# Altium footprint library Connector_PinHeader_1.27mm.PcbLib: 278 footprints (part 8 of 18)
Each footprint in its own frame and in the unit in brackets; x right, y up, seen from the top. Pads: shape width x height; smd on the part's side, far side on the other; paste and mask are expansions set on the pad; w line width, h text height; cw(c..) or ccw(c..) is an arc to the next point about the centre after c.
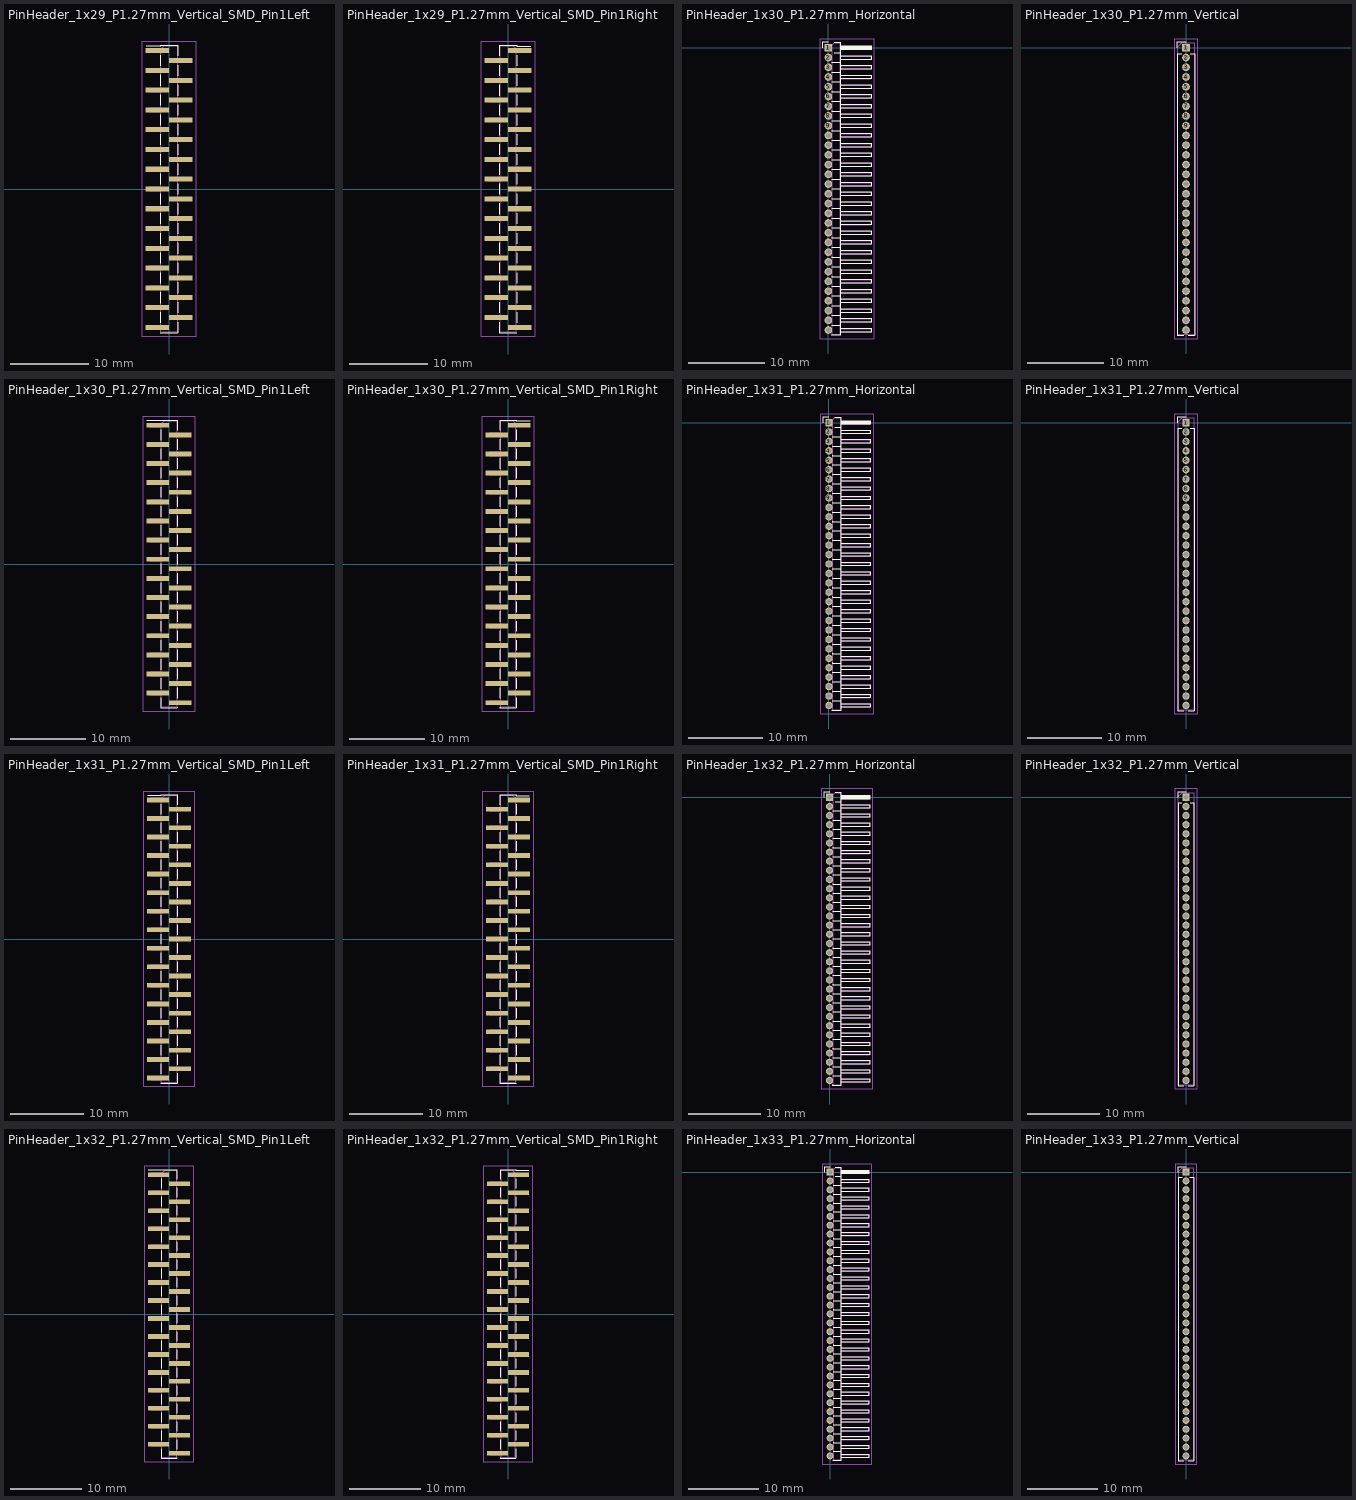
[diagram p7: the footprints below, top view; thin cyan lines are the x and y axes]

## PinHeader_1x29_P1.27mm_Vertical_SMD_Pin1Left [mm]
pads (29):
  rect 3x0.65 smd: 1(-1.5,17.78) 2(1.5,16.51) 3(-1.5,15.24) 4(1.5,13.97) 5(-1.5,12.7) 6(1.5,11.43) 7(-1.5,10.16) 8(1.5,8.89) 9(-1.5,7.62) 10(1.5,6.35) 11(-1.5,5.08) 12(1.5,3.81) 13(-1.5,2.54) 14(1.5,1.27) 15(-1.5,0) 16(1.5,-1.27) 17(-1.5,-2.54) 18(1.5,-3.81) 19(-1.5,-5.08) 20(1.5,-6.35) 21(-1.5,-7.62) 22(1.5,-8.89) 23(-1.5,-10.16) 24(1.5,-11.43) 25(-1.5,-12.7) 26(1.5,-13.97) 27(-1.5,-15.24) 28(1.5,-16.51) 29(-1.5,-17.78)
F.SilkS:
  lines w0.12: -2.94,18.365 -1.11,18.365 -1.11,18.475 1.11,18.475 ; -1.11,-18.475 1.11,-18.475 1.11,-18.365 ; -1.11,-17.195 -1.11,-15.825 ; -1.11,-14.655 -1.11,-13.285 ; -1.11,-12.115 -1.11,-10.745 ; -1.11,-9.575 -1.11,-8.205 ; -1.11,-7.035 -1.11,-5.665 ; -1.11,-4.495 -1.11,-3.125 ; -1.11,-1.955 -1.11,-0.585 ; -1.11,0.585 -1.11,1.955 ; -1.11,3.125 -1.11,4.495 ; -1.11,5.665 -1.11,7.035 ; -1.11,8.205 -1.11,9.575 ; -1.11,10.745 -1.11,12.115 ; -1.11,13.285 -1.11,14.655 ; -1.11,15.825 -1.11,17.195 ; 1.11,-18.465 1.11,-17.095 ; 1.11,-15.925 1.11,-14.555 ; 1.11,-13.385 1.11,-12.015 ; 1.11,-10.845 1.11,-9.475 ; 1.11,-8.305 1.11,-6.935 ; 1.11,-5.765 1.11,-4.395 ; 1.11,-3.225 1.11,-1.855 ; 1.11,-0.685 1.11,0.685 ; 1.11,1.855 1.11,3.225 ; 1.11,4.395 1.11,5.765 ; 1.11,6.935 1.11,8.305 ; 1.11,9.475 1.11,10.845 ; 1.11,12.015 1.11,13.385 ; 1.11,14.555 1.11,15.925 ; 1.11,17.095 1.11,18.465
F.CrtYd:
  lines w0.05: -3.5,-18.95 3.5,-18.95 3.5,18.95 -3.5,18.95 -3.5,-18.95
F.Fab:
  lines w0.1: -1.05,-17.98 -2.5,-17.98 -2.5,-17.58 -1.05,-17.58 ; -1.05,-15.44 -2.5,-15.44 -2.5,-15.04 -1.05,-15.04 ; -1.05,-12.9 -2.5,-12.9 -2.5,-12.5 -1.05,-12.5 ; -1.05,-10.36 -2.5,-10.36 -2.5,-9.96 -1.05,-9.96 ; -1.05,-7.82 -2.5,-7.82 -2.5,-7.42 -1.05,-7.42 ; -1.05,-5.28 -2.5,-5.28 -2.5,-4.88 -1.05,-4.88 ; -1.05,-2.74 -2.5,-2.74 -2.5,-2.34 -1.05,-2.34 ; -1.05,-0.2 -2.5,-0.2 -2.5,0.2 -1.05,0.2 ; -1.05,2.34 -2.5,2.34 -2.5,2.74 -1.05,2.74 ; -1.05,4.88 -2.5,4.88 -2.5,5.28 -1.05,5.28 ; -1.05,7.42 -2.5,7.42 -2.5,7.82 -1.05,7.82 ; -1.05,9.96 -2.5,9.96 -2.5,10.36 -1.05,10.36 ; -1.05,12.5 -2.5,12.5 -2.5,12.9 -1.05,12.9 ; -1.05,15.04 -2.5,15.04 -2.5,15.44 -1.05,15.44 ; -1.05,17.58 -2.5,17.58 -2.5,17.98 -1.05,17.98 ; 1.05,-16.71 2.5,-16.71 2.5,-16.31 1.05,-16.31 ; 1.05,-14.17 2.5,-14.17 2.5,-13.77 1.05,-13.77 ; 1.05,-11.63 2.5,-11.63 2.5,-11.23 1.05,-11.23 ; 1.05,-9.09 2.5,-9.09 2.5,-8.69 1.05,-8.69 ; 1.05,-6.55 2.5,-6.55 2.5,-6.15 1.05,-6.15 ; 1.05,-4.01 2.5,-4.01 2.5,-3.61 1.05,-3.61 ; 1.05,-1.47 2.5,-1.47 2.5,-1.07 1.05,-1.07 ; 1.05,1.07 2.5,1.07 2.5,1.47 1.05,1.47 ; 1.05,3.61 2.5,3.61 2.5,4.01 1.05,4.01 ; 1.05,6.15 2.5,6.15 2.5,6.55 1.05,6.55 ; 1.05,8.69 2.5,8.69 2.5,9.09 1.05,9.09 ; 1.05,11.23 2.5,11.23 2.5,11.63 1.05,11.63 ; 1.05,13.77 2.5,13.77 2.5,14.17 1.05,14.17 ; 1.05,16.31 2.5,16.31 2.5,16.71 1.05,16.71 ; -1.05,17.98 -0.615,18.415 1.05,18.415 1.05,-18.415 -1.05,-18.415 -1.05,17.98
  text "'.Designator'" at 0.84,-4.047 h1

## PinHeader_1x29_P1.27mm_Vertical_SMD_Pin1Right [mm]
pads (29):
  rect 3x0.65 smd: 1(1.5,17.78) 2(-1.5,16.51) 3(1.5,15.24) 4(-1.5,13.97) 5(1.5,12.7) 6(-1.5,11.43) 7(1.5,10.16) 8(-1.5,8.89) 9(1.5,7.62) 10(-1.5,6.35) 11(1.5,5.08) 12(-1.5,3.81) 13(1.5,2.54) 14(-1.5,1.27) 15(1.5,0) 16(-1.5,-1.27) 17(1.5,-2.54) 18(-1.5,-3.81) 19(1.5,-5.08) 20(-1.5,-6.35) 21(1.5,-7.62) 22(-1.5,-8.89) 23(1.5,-10.16) 24(-1.5,-11.43) 25(1.5,-12.7) 26(-1.5,-13.97) 27(1.5,-15.24) 28(-1.5,-16.51) 29(1.5,-17.78)
F.SilkS:
  lines w0.12: -1.11,-18.465 -1.11,-17.095 ; -1.11,-18.365 -1.11,-18.475 1.11,-18.475 ; -1.11,-15.925 -1.11,-14.555 ; -1.11,-13.385 -1.11,-12.015 ; -1.11,-10.845 -1.11,-9.475 ; -1.11,-8.305 -1.11,-6.935 ; -1.11,-5.765 -1.11,-4.395 ; -1.11,-3.225 -1.11,-1.855 ; -1.11,-0.685 -1.11,0.685 ; -1.11,1.855 -1.11,3.225 ; -1.11,4.395 -1.11,5.765 ; -1.11,6.935 -1.11,8.305 ; -1.11,9.475 -1.11,10.845 ; -1.11,12.015 -1.11,13.385 ; -1.11,14.555 -1.11,15.925 ; -1.11,17.095 -1.11,18.465 ; -1.11,18.475 1.11,18.475 1.11,18.365 2.94,18.365 ; 1.11,-17.195 1.11,-15.825 ; 1.11,-14.655 1.11,-13.285 ; 1.11,-12.115 1.11,-10.745 ; 1.11,-9.575 1.11,-8.205 ; 1.11,-7.035 1.11,-5.665 ; 1.11,-4.495 1.11,-3.125 ; 1.11,-1.955 1.11,-0.585 ; 1.11,0.585 1.11,1.955 ; 1.11,3.125 1.11,4.495 ; 1.11,5.665 1.11,7.035 ; 1.11,8.205 1.11,9.575 ; 1.11,10.745 1.11,12.115 ; 1.11,13.285 1.11,14.655 ; 1.11,15.825 1.11,17.195
F.CrtYd:
  lines w0.05: -3.5,-18.95 -3.5,18.95 3.5,18.95 3.5,-18.95 -3.5,-18.95
F.Fab:
  lines w0.1: -1.05,-16.71 -2.5,-16.71 -2.5,-16.31 -1.05,-16.31 ; -1.05,-14.17 -2.5,-14.17 -2.5,-13.77 -1.05,-13.77 ; -1.05,-11.63 -2.5,-11.63 -2.5,-11.23 -1.05,-11.23 ; -1.05,-9.09 -2.5,-9.09 -2.5,-8.69 -1.05,-8.69 ; -1.05,-6.55 -2.5,-6.55 -2.5,-6.15 -1.05,-6.15 ; -1.05,-4.01 -2.5,-4.01 -2.5,-3.61 -1.05,-3.61 ; -1.05,-1.47 -2.5,-1.47 -2.5,-1.07 -1.05,-1.07 ; -1.05,1.07 -2.5,1.07 -2.5,1.47 -1.05,1.47 ; -1.05,3.61 -2.5,3.61 -2.5,4.01 -1.05,4.01 ; -1.05,6.15 -2.5,6.15 -2.5,6.55 -1.05,6.55 ; -1.05,8.69 -2.5,8.69 -2.5,9.09 -1.05,9.09 ; -1.05,11.23 -2.5,11.23 -2.5,11.63 -1.05,11.63 ; -1.05,13.77 -2.5,13.77 -2.5,14.17 -1.05,14.17 ; -1.05,16.31 -2.5,16.31 -2.5,16.71 -1.05,16.71 ; 1.05,-17.98 2.5,-17.98 2.5,-17.58 1.05,-17.58 ; 1.05,-15.44 2.5,-15.44 2.5,-15.04 1.05,-15.04 ; 1.05,-12.9 2.5,-12.9 2.5,-12.5 1.05,-12.5 ; 1.05,-10.36 2.5,-10.36 2.5,-9.96 1.05,-9.96 ; 1.05,-7.82 2.5,-7.82 2.5,-7.42 1.05,-7.42 ; 1.05,-5.28 2.5,-5.28 2.5,-4.88 1.05,-4.88 ; 1.05,-2.74 2.5,-2.74 2.5,-2.34 1.05,-2.34 ; 1.05,-0.2 2.5,-0.2 2.5,0.2 1.05,0.2 ; 1.05,2.34 2.5,2.34 2.5,2.74 1.05,2.74 ; 1.05,4.88 2.5,4.88 2.5,5.28 1.05,5.28 ; 1.05,7.42 2.5,7.42 2.5,7.82 1.05,7.82 ; 1.05,9.96 2.5,9.96 2.5,10.36 1.05,10.36 ; 1.05,12.5 2.5,12.5 2.5,12.9 1.05,12.9 ; 1.05,15.04 2.5,15.04 2.5,15.44 1.05,15.44 ; 1.05,17.58 2.5,17.58 2.5,17.98 1.05,17.98 ; 1.05,17.98 1.05,-18.415 -1.05,-18.415 -1.05,18.415 0.615,18.415 1.05,17.98
  text "'.Designator'" at 0.84,-4.047 h1

## PinHeader_1x30_P1.27mm_Horizontal [mm]
pads (30):
  rect 1x1 hole 0.65: 1(0,0)
  rrect100% 1x1 hole 0.65: 2(0,-1.27) 3(0,-2.54) 4(0,-3.81) 5(0,-5.08) 6(0,-6.35) 7(0,-7.62) 8(0,-8.89) 9(0,-10.16) 10(0,-11.43) 11(0,-12.7) 12(0,-13.97) 13(0,-15.24) 14(0,-16.51) 15(0,-17.78) 16(0,-19.05) 17(0,-20.32) 18(0,-21.59) 19(0,-22.86) 20(0,-24.13) 21(0,-25.4) 22(0,-26.67) 23(0,-27.94) 24(0,-29.21) 25(0,-30.48) 26(0,-31.75) 27(0,-33.02) 28(0,-34.29) 29(0,-35.56) 30(0,-36.83)
F.SilkS:
  drawing of 157 lines, arcs and shapes, not listed
F.CrtYd:
  lines w0.05: -1.15,-38 -1.15,1.15 6,1.15 6,-38 -1.15,-38
F.Fab:
  drawing of 185 lines, arcs and shapes, not listed
  text "'.Designator'" at 1.504,-20.843 h0.6

## PinHeader_1x30_P1.27mm_Vertical [mm]
pads (30):
  rect 1x1 hole 0.65: 1(0,0)
  rrect100% 1x1 hole 0.65: 2(0,-1.27) 3(0,-2.54) 4(0,-3.81) 5(0,-5.08) 6(0,-6.35) 7(0,-7.62) 8(0,-8.89) 9(0,-10.16) 10(0,-11.43) 11(0,-12.7) 12(0,-13.97) 13(0,-15.24) 14(0,-16.51) 15(0,-17.78) 16(0,-19.05) 17(0,-20.32) 18(0,-21.59) 19(0,-22.86) 20(0,-24.13) 21(0,-25.4) 22(0,-26.67) 23(0,-27.94) 24(0,-29.21) 25(0,-30.48) 26(0,-31.75) 27(0,-33.02) 28(0,-34.29) 29(0,-35.56) 30(0,-36.83)
F.SilkS:
  lines w0.12: -1.11,0 -1.11,0.76 0,0.76 ; -0.563,-0.76 -1.11,-0.76 -1.11,-37.525 -0.308,-37.525 ; 0.308,-37.525 1.11,-37.525 1.11,-0.76 0.563,-0.76
F.CrtYd:
  lines w0.05: -1.55,-38 1.55,-38 1.55,1.15 -1.55,1.15 -1.55,-38
F.Fab:
  lines w0.1: -1.05,-37.465 -1.05,0.11 -0.525,0.635 1.05,0.635 1.05,-37.465 -1.05,-37.465
  text "'.Designator'" at 0.84,-22.462 h1

## PinHeader_1x30_P1.27mm_Vertical_SMD_Pin1Left [mm]
pads (30):
  rect 3x0.65 smd: 1(-1.5,18.415) 2(1.5,17.145) 3(-1.5,15.875) 4(1.5,14.605) 5(-1.5,13.335) 6(1.5,12.065) 7(-1.5,10.795) 8(1.5,9.525) 9(-1.5,8.255) 10(1.5,6.985) 11(-1.5,5.715) 12(1.5,4.445) 13(-1.5,3.175) 14(1.5,1.905) 15(-1.5,0.635) 16(1.5,-0.635) 17(-1.5,-1.905) 18(1.5,-3.175) 19(-1.5,-4.445) 20(1.5,-5.715) 21(-1.5,-6.985) 22(1.5,-8.255) 23(-1.5,-9.525) 24(1.5,-10.795) 25(-1.5,-12.065) 26(1.5,-13.335) 27(-1.5,-14.605) 28(1.5,-15.875) 29(-1.5,-17.145) 30(1.5,-18.415)
F.SilkS:
  lines w0.12: -2.94,19 -1.11,19 -1.11,19.11 1.11,19.11 ; -1.11,-19.11 1.11,-19.11 1.11,-19 ; -1.11,-19.1 -1.11,-17.73 ; -1.11,-16.56 -1.11,-15.19 ; -1.11,-14.02 -1.11,-12.65 ; -1.11,-11.48 -1.11,-10.11 ; -1.11,-8.94 -1.11,-7.57 ; -1.11,-6.4 -1.11,-5.03 ; -1.11,-3.86 -1.11,-2.49 ; -1.11,-1.32 -1.11,0.05 ; -1.11,1.22 -1.11,2.59 ; -1.11,3.76 -1.11,5.13 ; -1.11,6.3 -1.11,7.67 ; -1.11,8.84 -1.11,10.21 ; -1.11,11.38 -1.11,12.75 ; -1.11,13.92 -1.11,15.29 ; -1.11,16.46 -1.11,17.83 ; 1.11,-17.83 1.11,-16.46 ; 1.11,-15.29 1.11,-13.92 ; 1.11,-12.75 1.11,-11.38 ; 1.11,-10.21 1.11,-8.84 ; 1.11,-7.67 1.11,-6.3 ; 1.11,-5.13 1.11,-3.76 ; 1.11,-2.59 1.11,-1.22 ; 1.11,-0.05 1.11,1.32 ; 1.11,2.49 1.11,3.86 ; 1.11,5.03 1.11,6.4 ; 1.11,7.57 1.11,8.94 ; 1.11,10.11 1.11,11.48 ; 1.11,12.65 1.11,14.02 ; 1.11,15.19 1.11,16.56 ; 1.11,17.73 1.11,19.1
F.CrtYd:
  lines w0.05: -3.5,-19.55 3.5,-19.55 3.5,19.55 -3.5,19.55 -3.5,-19.55
F.Fab:
  lines w0.1: -1.05,-17.345 -2.5,-17.345 -2.5,-16.945 -1.05,-16.945 ; -1.05,-14.805 -2.5,-14.805 -2.5,-14.405 -1.05,-14.405 ; -1.05,-12.265 -2.5,-12.265 -2.5,-11.865 -1.05,-11.865 ; -1.05,-9.725 -2.5,-9.725 -2.5,-9.325 -1.05,-9.325 ; -1.05,-7.185 -2.5,-7.185 -2.5,-6.785 -1.05,-6.785 ; -1.05,-4.645 -2.5,-4.645 -2.5,-4.245 -1.05,-4.245 ; -1.05,-2.105 -2.5,-2.105 -2.5,-1.705 -1.05,-1.705 ; -1.05,0.435 -2.5,0.435 -2.5,0.835 -1.05,0.835 ; -1.05,2.975 -2.5,2.975 -2.5,3.375 -1.05,3.375 ; -1.05,5.515 -2.5,5.515 -2.5,5.915 -1.05,5.915 ; -1.05,8.055 -2.5,8.055 -2.5,8.455 -1.05,8.455 ; -1.05,10.595 -2.5,10.595 -2.5,10.995 -1.05,10.995 ; -1.05,13.135 -2.5,13.135 -2.5,13.535 -1.05,13.535 ; -1.05,15.675 -2.5,15.675 -2.5,16.075 -1.05,16.075 ; -1.05,18.215 -2.5,18.215 -2.5,18.615 -1.05,18.615 ; 1.05,-18.615 2.5,-18.615 2.5,-18.215 1.05,-18.215 ; 1.05,-16.075 2.5,-16.075 2.5,-15.675 1.05,-15.675 ; 1.05,-13.535 2.5,-13.535 2.5,-13.135 1.05,-13.135 ; 1.05,-10.995 2.5,-10.995 2.5,-10.595 1.05,-10.595 ; 1.05,-8.455 2.5,-8.455 2.5,-8.055 1.05,-8.055 ; 1.05,-5.915 2.5,-5.915 2.5,-5.515 1.05,-5.515 ; 1.05,-3.375 2.5,-3.375 2.5,-2.975 1.05,-2.975 ; 1.05,-0.835 2.5,-0.835 2.5,-0.435 1.05,-0.435 ; 1.05,1.705 2.5,1.705 2.5,2.105 1.05,2.105 ; 1.05,4.245 2.5,4.245 2.5,4.645 1.05,4.645 ; 1.05,6.785 2.5,6.785 2.5,7.185 1.05,7.185 ; 1.05,9.325 2.5,9.325 2.5,9.725 1.05,9.725 ; 1.05,11.865 2.5,11.865 2.5,12.265 1.05,12.265 ; 1.05,14.405 2.5,14.405 2.5,14.805 1.05,14.805 ; 1.05,16.945 2.5,16.945 2.5,17.345 1.05,17.345 ; -1.05,18.615 -0.615,19.05 1.05,19.05 1.05,-19.05 -1.05,-19.05 -1.05,18.615
  text "'.Designator'" at 0.84,-4.047 h1

## PinHeader_1x30_P1.27mm_Vertical_SMD_Pin1Right [mm]
pads (30):
  rect 3x0.65 smd: 1(1.5,18.415) 2(-1.5,17.145) 3(1.5,15.875) 4(-1.5,14.605) 5(1.5,13.335) 6(-1.5,12.065) 7(1.5,10.795) 8(-1.5,9.525) 9(1.5,8.255) 10(-1.5,6.985) 11(1.5,5.715) 12(-1.5,4.445) 13(1.5,3.175) 14(-1.5,1.905) 15(1.5,0.635) 16(-1.5,-0.635) 17(1.5,-1.905) 18(-1.5,-3.175) 19(1.5,-4.445) 20(-1.5,-5.715) 21(1.5,-6.985) 22(-1.5,-8.255) 23(1.5,-9.525) 24(-1.5,-10.795) 25(1.5,-12.065) 26(-1.5,-13.335) 27(1.5,-14.605) 28(-1.5,-15.875) 29(1.5,-17.145) 30(-1.5,-18.415)
F.SilkS:
  lines w0.12: -1.11,-19 -1.11,-19.11 1.11,-19.11 ; -1.11,-17.83 -1.11,-16.46 ; -1.11,-15.29 -1.11,-13.92 ; -1.11,-12.75 -1.11,-11.38 ; -1.11,-10.21 -1.11,-8.84 ; -1.11,-7.67 -1.11,-6.3 ; -1.11,-5.13 -1.11,-3.76 ; -1.11,-2.59 -1.11,-1.22 ; -1.11,-0.05 -1.11,1.32 ; -1.11,2.49 -1.11,3.86 ; -1.11,5.03 -1.11,6.4 ; -1.11,7.57 -1.11,8.94 ; -1.11,10.11 -1.11,11.48 ; -1.11,12.65 -1.11,14.02 ; -1.11,15.19 -1.11,16.56 ; -1.11,17.73 -1.11,19.1 ; -1.11,19.11 1.11,19.11 1.11,19 2.94,19 ; 1.11,-19.1 1.11,-17.73 ; 1.11,-16.56 1.11,-15.19 ; 1.11,-14.02 1.11,-12.65 ; 1.11,-11.48 1.11,-10.11 ; 1.11,-8.94 1.11,-7.57 ; 1.11,-6.4 1.11,-5.03 ; 1.11,-3.86 1.11,-2.49 ; 1.11,-1.32 1.11,0.05 ; 1.11,1.22 1.11,2.59 ; 1.11,3.76 1.11,5.13 ; 1.11,6.3 1.11,7.67 ; 1.11,8.84 1.11,10.21 ; 1.11,11.38 1.11,12.75 ; 1.11,13.92 1.11,15.29 ; 1.11,16.46 1.11,17.83
F.CrtYd:
  lines w0.05: -3.5,-19.55 -3.5,19.55 3.5,19.55 3.5,-19.55 -3.5,-19.55
F.Fab:
  lines w0.1: -1.05,-18.615 -2.5,-18.615 -2.5,-18.215 -1.05,-18.215 ; -1.05,-16.075 -2.5,-16.075 -2.5,-15.675 -1.05,-15.675 ; -1.05,-13.535 -2.5,-13.535 -2.5,-13.135 -1.05,-13.135 ; -1.05,-10.995 -2.5,-10.995 -2.5,-10.595 -1.05,-10.595 ; -1.05,-8.455 -2.5,-8.455 -2.5,-8.055 -1.05,-8.055 ; -1.05,-5.915 -2.5,-5.915 -2.5,-5.515 -1.05,-5.515 ; -1.05,-3.375 -2.5,-3.375 -2.5,-2.975 -1.05,-2.975 ; -1.05,-0.835 -2.5,-0.835 -2.5,-0.435 -1.05,-0.435 ; -1.05,1.705 -2.5,1.705 -2.5,2.105 -1.05,2.105 ; -1.05,4.245 -2.5,4.245 -2.5,4.645 -1.05,4.645 ; -1.05,6.785 -2.5,6.785 -2.5,7.185 -1.05,7.185 ; -1.05,9.325 -2.5,9.325 -2.5,9.725 -1.05,9.725 ; -1.05,11.865 -2.5,11.865 -2.5,12.265 -1.05,12.265 ; -1.05,14.405 -2.5,14.405 -2.5,14.805 -1.05,14.805 ; -1.05,16.945 -2.5,16.945 -2.5,17.345 -1.05,17.345 ; 1.05,-17.345 2.5,-17.345 2.5,-16.945 1.05,-16.945 ; 1.05,-14.805 2.5,-14.805 2.5,-14.405 1.05,-14.405 ; 1.05,-12.265 2.5,-12.265 2.5,-11.865 1.05,-11.865 ; 1.05,-9.725 2.5,-9.725 2.5,-9.325 1.05,-9.325 ; 1.05,-7.185 2.5,-7.185 2.5,-6.785 1.05,-6.785 ; 1.05,-4.645 2.5,-4.645 2.5,-4.245 1.05,-4.245 ; 1.05,-2.105 2.5,-2.105 2.5,-1.705 1.05,-1.705 ; 1.05,0.435 2.5,0.435 2.5,0.835 1.05,0.835 ; 1.05,2.975 2.5,2.975 2.5,3.375 1.05,3.375 ; 1.05,5.515 2.5,5.515 2.5,5.915 1.05,5.915 ; 1.05,8.055 2.5,8.055 2.5,8.455 1.05,8.455 ; 1.05,10.595 2.5,10.595 2.5,10.995 1.05,10.995 ; 1.05,13.135 2.5,13.135 2.5,13.535 1.05,13.535 ; 1.05,15.675 2.5,15.675 2.5,16.075 1.05,16.075 ; 1.05,18.215 2.5,18.215 2.5,18.615 1.05,18.615 ; 1.05,18.615 0.615,19.05 -1.05,19.05 -1.05,-19.05 1.05,-19.05 1.05,18.615
  text "'.Designator'" at 0.84,-4.047 h1

## PinHeader_1x31_P1.27mm_Horizontal [mm]
pads (31):
  rect 1x1 hole 0.65: 1(0,0)
  rrect100% 1x1 hole 0.65: 2(0,-1.27) 3(0,-2.54) 4(0,-3.81) 5(0,-5.08) 6(0,-6.35) 7(0,-7.62) 8(0,-8.89) 9(0,-10.16) 10(0,-11.43) 11(0,-12.7) 12(0,-13.97) 13(0,-15.24) 14(0,-16.51) 15(0,-17.78) 16(0,-19.05) 17(0,-20.32) 18(0,-21.59) 19(0,-22.86) 20(0,-24.13) 21(0,-25.4) 22(0,-26.67) 23(0,-27.94) 24(0,-29.21) 25(0,-30.48) 26(0,-31.75) 27(0,-33.02) 28(0,-34.29) 29(0,-35.56) 30(0,-36.83) 31(0,-38.1)
F.SilkS:
  drawing of 162 lines, arcs and shapes, not listed
F.CrtYd:
  lines w0.05: -1.15,-39.25 -1.15,1.15 6,1.15 6,-39.25 -1.15,-39.25
F.Fab:
  drawing of 191 lines, arcs and shapes, not listed
  text "'.Designator'" at 1.504,-21.478 h0.6

## PinHeader_1x31_P1.27mm_Vertical [mm]
pads (31):
  rect 1x1 hole 0.65: 1(0,0)
  rrect100% 1x1 hole 0.65: 2(0,-1.27) 3(0,-2.54) 4(0,-3.81) 5(0,-5.08) 6(0,-6.35) 7(0,-7.62) 8(0,-8.89) 9(0,-10.16) 10(0,-11.43) 11(0,-12.7) 12(0,-13.97) 13(0,-15.24) 14(0,-16.51) 15(0,-17.78) 16(0,-19.05) 17(0,-20.32) 18(0,-21.59) 19(0,-22.86) 20(0,-24.13) 21(0,-25.4) 22(0,-26.67) 23(0,-27.94) 24(0,-29.21) 25(0,-30.48) 26(0,-31.75) 27(0,-33.02) 28(0,-34.29) 29(0,-35.56) 30(0,-36.83) 31(0,-38.1)
F.SilkS:
  lines w0.12: -1.11,0 -1.11,0.76 0,0.76 ; -0.563,-0.76 -1.11,-0.76 -1.11,-38.795 -0.308,-38.795 ; 0.308,-38.795 1.11,-38.795 1.11,-0.76 0.563,-0.76
F.CrtYd:
  lines w0.05: -1.55,-39.25 -1.55,1.15 1.55,1.15 1.55,-39.25 -1.55,-39.25
F.Fab:
  lines w0.1: -1.05,-38.735 -1.05,0.11 -0.525,0.635 1.05,0.635 1.05,-38.735 -1.05,-38.735
  text "'.Designator'" at 0.84,-23.097 h1

## PinHeader_1x31_P1.27mm_Vertical_SMD_Pin1Left [mm]
pads (31):
  rect 3x0.65 smd: 1(-1.5,19.05) 2(1.5,17.78) 3(-1.5,16.51) 4(1.5,15.24) 5(-1.5,13.97) 6(1.5,12.7) 7(-1.5,11.43) 8(1.5,10.16) 9(-1.5,8.89) 10(1.5,7.62) 11(-1.5,6.35) 12(1.5,5.08) 13(-1.5,3.81) 14(1.5,2.54) 15(-1.5,1.27) 16(1.5,0) 17(-1.5,-1.27) 18(1.5,-2.54) 19(-1.5,-3.81) 20(1.5,-5.08) 21(-1.5,-6.35) 22(1.5,-7.62) 23(-1.5,-8.89) 24(1.5,-10.16) 25(-1.5,-11.43) 26(1.5,-12.7) 27(-1.5,-13.97) 28(1.5,-15.24) 29(-1.5,-16.51) 30(1.5,-17.78) 31(-1.5,-19.05)
F.SilkS:
  lines w0.12: -2.94,19.635 -1.11,19.635 -1.11,19.745 1.11,19.745 ; -1.11,-19.745 1.11,-19.745 1.11,-19.635 ; -1.11,-18.465 -1.11,-17.095 ; -1.11,-15.925 -1.11,-14.555 ; -1.11,-13.385 -1.11,-12.015 ; -1.11,-10.845 -1.11,-9.475 ; -1.11,-8.305 -1.11,-6.935 ; -1.11,-5.765 -1.11,-4.395 ; -1.11,-3.225 -1.11,-1.855 ; -1.11,-0.685 -1.11,0.685 ; -1.11,1.855 -1.11,3.225 ; -1.11,4.395 -1.11,5.765 ; -1.11,6.935 -1.11,8.305 ; -1.11,9.475 -1.11,10.845 ; -1.11,12.015 -1.11,13.385 ; -1.11,14.555 -1.11,15.925 ; -1.11,17.095 -1.11,18.465 ; 1.11,-19.735 1.11,-18.365 ; 1.11,-17.195 1.11,-15.825 ; 1.11,-14.655 1.11,-13.285 ; 1.11,-12.115 1.11,-10.745 ; 1.11,-9.575 1.11,-8.205 ; 1.11,-7.035 1.11,-5.665 ; 1.11,-4.495 1.11,-3.125 ; 1.11,-1.955 1.11,-0.585 ; 1.11,0.585 1.11,1.955 ; 1.11,3.125 1.11,4.495 ; 1.11,5.665 1.11,7.035 ; 1.11,8.205 1.11,9.575 ; 1.11,10.745 1.11,12.115 ; 1.11,13.285 1.11,14.655 ; 1.11,15.825 1.11,17.195 ; 1.11,18.365 1.11,19.735
F.CrtYd:
  lines w0.05: -3.5,-20.2 3.5,-20.2 3.5,20.2 -3.5,20.2 -3.5,-20.2
F.Fab:
  lines w0.1: -1.05,-19.25 -2.5,-19.25 -2.5,-18.85 -1.05,-18.85 ; -1.05,-16.71 -2.5,-16.71 -2.5,-16.31 -1.05,-16.31 ; -1.05,-14.17 -2.5,-14.17 -2.5,-13.77 -1.05,-13.77 ; -1.05,-11.63 -2.5,-11.63 -2.5,-11.23 -1.05,-11.23 ; -1.05,-9.09 -2.5,-9.09 -2.5,-8.69 -1.05,-8.69 ; -1.05,-6.55 -2.5,-6.55 -2.5,-6.15 -1.05,-6.15 ; -1.05,-4.01 -2.5,-4.01 -2.5,-3.61 -1.05,-3.61 ; -1.05,-1.47 -2.5,-1.47 -2.5,-1.07 -1.05,-1.07 ; -1.05,1.07 -2.5,1.07 -2.5,1.47 -1.05,1.47 ; -1.05,3.61 -2.5,3.61 -2.5,4.01 -1.05,4.01 ; -1.05,6.15 -2.5,6.15 -2.5,6.55 -1.05,6.55 ; -1.05,8.69 -2.5,8.69 -2.5,9.09 -1.05,9.09 ; -1.05,11.23 -2.5,11.23 -2.5,11.63 -1.05,11.63 ; -1.05,13.77 -2.5,13.77 -2.5,14.17 -1.05,14.17 ; -1.05,16.31 -2.5,16.31 -2.5,16.71 -1.05,16.71 ; -1.05,18.85 -2.5,18.85 -2.5,19.25 -1.05,19.25 ; 1.05,-17.98 2.5,-17.98 2.5,-17.58 1.05,-17.58 ; 1.05,-15.44 2.5,-15.44 2.5,-15.04 1.05,-15.04 ; 1.05,-12.9 2.5,-12.9 2.5,-12.5 1.05,-12.5 ; 1.05,-10.36 2.5,-10.36 2.5,-9.96 1.05,-9.96 ; 1.05,-7.82 2.5,-7.82 2.5,-7.42 1.05,-7.42 ; 1.05,-5.28 2.5,-5.28 2.5,-4.88 1.05,-4.88 ; 1.05,-2.74 2.5,-2.74 2.5,-2.34 1.05,-2.34 ; 1.05,-0.2 2.5,-0.2 2.5,0.2 1.05,0.2 ; 1.05,2.34 2.5,2.34 2.5,2.74 1.05,2.74 ; 1.05,4.88 2.5,4.88 2.5,5.28 1.05,5.28 ; 1.05,7.42 2.5,7.42 2.5,7.82 1.05,7.82 ; 1.05,9.96 2.5,9.96 2.5,10.36 1.05,10.36 ; 1.05,12.5 2.5,12.5 2.5,12.9 1.05,12.9 ; 1.05,15.04 2.5,15.04 2.5,15.44 1.05,15.44 ; 1.05,17.58 2.5,17.58 2.5,17.98 1.05,17.98 ; -1.05,19.25 -0.615,19.685 1.05,19.685 1.05,-19.685 -1.05,-19.685 -1.05,19.25
  text "'.Designator'" at 0.84,-4.047 h1

## PinHeader_1x31_P1.27mm_Vertical_SMD_Pin1Right [mm]
pads (31):
  rect 3x0.65 smd: 1(1.5,19.05) 2(-1.5,17.78) 3(1.5,16.51) 4(-1.5,15.24) 5(1.5,13.97) 6(-1.5,12.7) 7(1.5,11.43) 8(-1.5,10.16) 9(1.5,8.89) 10(-1.5,7.62) 11(1.5,6.35) 12(-1.5,5.08) 13(1.5,3.81) 14(-1.5,2.54) 15(1.5,1.27) 16(-1.5,0) 17(1.5,-1.27) 18(-1.5,-2.54) 19(1.5,-3.81) 20(-1.5,-5.08) 21(1.5,-6.35) 22(-1.5,-7.62) 23(1.5,-8.89) 24(-1.5,-10.16) 25(1.5,-11.43) 26(-1.5,-12.7) 27(1.5,-13.97) 28(-1.5,-15.24) 29(1.5,-16.51) 30(-1.5,-17.78) 31(1.5,-19.05)
F.SilkS:
  lines w0.12: -1.11,-19.735 -1.11,-18.365 ; -1.11,-19.635 -1.11,-19.745 1.11,-19.745 ; -1.11,-17.195 -1.11,-15.825 ; -1.11,-14.655 -1.11,-13.285 ; -1.11,-12.115 -1.11,-10.745 ; -1.11,-9.575 -1.11,-8.205 ; -1.11,-7.035 -1.11,-5.665 ; -1.11,-4.495 -1.11,-3.125 ; -1.11,-1.955 -1.11,-0.585 ; -1.11,0.585 -1.11,1.955 ; -1.11,3.125 -1.11,4.495 ; -1.11,5.665 -1.11,7.035 ; -1.11,8.205 -1.11,9.575 ; -1.11,10.745 -1.11,12.115 ; -1.11,13.285 -1.11,14.655 ; -1.11,15.825 -1.11,17.195 ; -1.11,18.365 -1.11,19.735 ; -1.11,19.745 1.11,19.745 1.11,19.635 2.94,19.635 ; 1.11,-18.465 1.11,-17.095 ; 1.11,-15.925 1.11,-14.555 ; 1.11,-13.385 1.11,-12.015 ; 1.11,-10.845 1.11,-9.475 ; 1.11,-8.305 1.11,-6.935 ; 1.11,-5.765 1.11,-4.395 ; 1.11,-3.225 1.11,-1.855 ; 1.11,-0.685 1.11,0.685 ; 1.11,1.855 1.11,3.225 ; 1.11,4.395 1.11,5.765 ; 1.11,6.935 1.11,8.305 ; 1.11,9.475 1.11,10.845 ; 1.11,12.015 1.11,13.385 ; 1.11,14.555 1.11,15.925 ; 1.11,17.095 1.11,18.465
F.CrtYd:
  lines w0.05: -3.5,-20.2 -3.5,20.2 3.5,20.2 3.5,-20.2 -3.5,-20.2
F.Fab:
  lines w0.1: -1.05,-17.98 -2.5,-17.98 -2.5,-17.58 -1.05,-17.58 ; -1.05,-15.44 -2.5,-15.44 -2.5,-15.04 -1.05,-15.04 ; -1.05,-12.9 -2.5,-12.9 -2.5,-12.5 -1.05,-12.5 ; -1.05,-10.36 -2.5,-10.36 -2.5,-9.96 -1.05,-9.96 ; -1.05,-7.82 -2.5,-7.82 -2.5,-7.42 -1.05,-7.42 ; -1.05,-5.28 -2.5,-5.28 -2.5,-4.88 -1.05,-4.88 ; -1.05,-2.74 -2.5,-2.74 -2.5,-2.34 -1.05,-2.34 ; -1.05,-0.2 -2.5,-0.2 -2.5,0.2 -1.05,0.2 ; -1.05,2.34 -2.5,2.34 -2.5,2.74 -1.05,2.74 ; -1.05,4.88 -2.5,4.88 -2.5,5.28 -1.05,5.28 ; -1.05,7.42 -2.5,7.42 -2.5,7.82 -1.05,7.82 ; -1.05,9.96 -2.5,9.96 -2.5,10.36 -1.05,10.36 ; -1.05,12.5 -2.5,12.5 -2.5,12.9 -1.05,12.9 ; -1.05,15.04 -2.5,15.04 -2.5,15.44 -1.05,15.44 ; -1.05,17.58 -2.5,17.58 -2.5,17.98 -1.05,17.98 ; 1.05,-19.25 2.5,-19.25 2.5,-18.85 1.05,-18.85 ; 1.05,-16.71 2.5,-16.71 2.5,-16.31 1.05,-16.31 ; 1.05,-14.17 2.5,-14.17 2.5,-13.77 1.05,-13.77 ; 1.05,-11.63 2.5,-11.63 2.5,-11.23 1.05,-11.23 ; 1.05,-9.09 2.5,-9.09 2.5,-8.69 1.05,-8.69 ; 1.05,-6.55 2.5,-6.55 2.5,-6.15 1.05,-6.15 ; 1.05,-4.01 2.5,-4.01 2.5,-3.61 1.05,-3.61 ; 1.05,-1.47 2.5,-1.47 2.5,-1.07 1.05,-1.07 ; 1.05,1.07 2.5,1.07 2.5,1.47 1.05,1.47 ; 1.05,3.61 2.5,3.61 2.5,4.01 1.05,4.01 ; 1.05,6.15 2.5,6.15 2.5,6.55 1.05,6.55 ; 1.05,8.69 2.5,8.69 2.5,9.09 1.05,9.09 ; 1.05,11.23 2.5,11.23 2.5,11.63 1.05,11.63 ; 1.05,13.77 2.5,13.77 2.5,14.17 1.05,14.17 ; 1.05,16.31 2.5,16.31 2.5,16.71 1.05,16.71 ; 1.05,18.85 2.5,18.85 2.5,19.25 1.05,19.25 ; 1.05,19.25 1.05,-19.685 -1.05,-19.685 -1.05,19.685 0.615,19.685 1.05,19.25
  text "'.Designator'" at 0.84,-4.047 h1

## PinHeader_1x32_P1.27mm_Horizontal [mm]
pads (32):
  rect 1x1 hole 0.65: 1(0,0)
  rrect100% 1x1 hole 0.65: 2(0,-1.27) 3(0,-2.54) 4(0,-3.81) 5(0,-5.08) 6(0,-6.35) 7(0,-7.62) 8(0,-8.89) 9(0,-10.16) 10(0,-11.43) 11(0,-12.7) 12(0,-13.97) 13(0,-15.24) 14(0,-16.51) 15(0,-17.78) 16(0,-19.05) 17(0,-20.32) 18(0,-21.59) 19(0,-22.86) 20(0,-24.13) 21(0,-25.4) 22(0,-26.67) 23(0,-27.94) 24(0,-29.21) 25(0,-30.48) 26(0,-31.75) 27(0,-33.02) 28(0,-34.29) 29(0,-35.56) 30(0,-36.83) 31(0,-38.1) 32(0,-39.37)
F.SilkS:
  drawing of 167 lines, arcs and shapes, not listed
F.CrtYd:
  lines w0.05: -1.15,-40.55 -1.15,1.15 6,1.15 6,-40.55 -1.15,-40.55
F.Fab:
  drawing of 197 lines, arcs and shapes, not listed
  text "'.Designator'" at 1.504,-22.113 h0.6

## PinHeader_1x32_P1.27mm_Vertical [mm]
pads (32):
  rect 1x1 hole 0.65: 1(0,0)
  rrect100% 1x1 hole 0.65: 2(0,-1.27) 3(0,-2.54) 4(0,-3.81) 5(0,-5.08) 6(0,-6.35) 7(0,-7.62) 8(0,-8.89) 9(0,-10.16) 10(0,-11.43) 11(0,-12.7) 12(0,-13.97) 13(0,-15.24) 14(0,-16.51) 15(0,-17.78) 16(0,-19.05) 17(0,-20.32) 18(0,-21.59) 19(0,-22.86) 20(0,-24.13) 21(0,-25.4) 22(0,-26.67) 23(0,-27.94) 24(0,-29.21) 25(0,-30.48) 26(0,-31.75) 27(0,-33.02) 28(0,-34.29) 29(0,-35.56) 30(0,-36.83) 31(0,-38.1) 32(0,-39.37)
F.SilkS:
  lines w0.12: -1.11,0 -1.11,0.76 0,0.76 ; -0.563,-0.76 -1.11,-0.76 -1.11,-40.065 -0.308,-40.065 ; 0.308,-40.065 1.11,-40.065 1.11,-0.76 0.563,-0.76
F.CrtYd:
  lines w0.05: -1.55,-40.55 1.55,-40.55 1.55,1.15 -1.55,1.15 -1.55,-40.55
F.Fab:
  lines w0.1: -1.05,-40.005 -1.05,0.11 -0.525,0.635 1.05,0.635 1.05,-40.005 -1.05,-40.005
  text "'.Designator'" at 0.84,-23.732 h1

## PinHeader_1x32_P1.27mm_Vertical_SMD_Pin1Left [mm]
pads (32):
  rect 3x0.65 smd: 1(-1.5,19.685) 2(1.5,18.415) 3(-1.5,17.145) 4(1.5,15.875) 5(-1.5,14.605) 6(1.5,13.335) 7(-1.5,12.065) 8(1.5,10.795) 9(-1.5,9.525) 10(1.5,8.255) 11(-1.5,6.985) 12(1.5,5.715) 13(-1.5,4.445) 14(1.5,3.175) 15(-1.5,1.905) 16(1.5,0.635) 17(-1.5,-0.635) 18(1.5,-1.905) 19(-1.5,-3.175) 20(1.5,-4.445) 21(-1.5,-5.715) 22(1.5,-6.985) 23(-1.5,-8.255) 24(1.5,-9.525) 25(-1.5,-10.795) 26(1.5,-12.065) 27(-1.5,-13.335) 28(1.5,-14.605) 29(-1.5,-15.875) 30(1.5,-17.145) 31(-1.5,-18.415) 32(1.5,-19.685)
F.SilkS:
  lines w0.12: -2.94,20.27 -1.11,20.27 -1.11,20.38 1.11,20.38 ; -1.11,-20.38 1.11,-20.38 1.11,-20.27 ; -1.11,-20.37 -1.11,-19 ; -1.11,-17.83 -1.11,-16.46 ; -1.11,-15.29 -1.11,-13.92 ; -1.11,-12.75 -1.11,-11.38 ; -1.11,-10.21 -1.11,-8.84 ; -1.11,-7.67 -1.11,-6.3 ; -1.11,-5.13 -1.11,-3.76 ; -1.11,-2.59 -1.11,-1.22 ; -1.11,-0.05 -1.11,1.32 ; -1.11,2.49 -1.11,3.86 ; -1.11,5.03 -1.11,6.4 ; -1.11,7.57 -1.11,8.94 ; -1.11,10.11 -1.11,11.48 ; -1.11,12.65 -1.11,14.02 ; -1.11,15.19 -1.11,16.56 ; -1.11,17.73 -1.11,19.1 ; 1.11,-19.1 1.11,-17.73 ; 1.11,-16.56 1.11,-15.19 ; 1.11,-14.02 1.11,-12.65 ; 1.11,-11.48 1.11,-10.11 ; 1.11,-8.94 1.11,-7.57 ; 1.11,-6.4 1.11,-5.03 ; 1.11,-3.86 1.11,-2.49 ; 1.11,-1.32 1.11,0.05 ; 1.11,1.22 1.11,2.59 ; 1.11,3.76 1.11,5.13 ; 1.11,6.3 1.11,7.67 ; 1.11,8.84 1.11,10.21 ; 1.11,11.38 1.11,12.75 ; 1.11,13.92 1.11,15.29 ; 1.11,16.46 1.11,17.83 ; 1.11,19 1.11,20.37
F.CrtYd:
  lines w0.05: -3.5,-20.85 -3.5,20.85 3.5,20.85 3.5,-20.85 -3.5,-20.85
F.Fab:
  lines w0.1: -1.05,-18.615 -2.5,-18.615 -2.5,-18.215 -1.05,-18.215 ; -1.05,-16.075 -2.5,-16.075 -2.5,-15.675 -1.05,-15.675 ; -1.05,-13.535 -2.5,-13.535 -2.5,-13.135 -1.05,-13.135 ; -1.05,-10.995 -2.5,-10.995 -2.5,-10.595 -1.05,-10.595 ; -1.05,-8.455 -2.5,-8.455 -2.5,-8.055 -1.05,-8.055 ; -1.05,-5.915 -2.5,-5.915 -2.5,-5.515 -1.05,-5.515 ; -1.05,-3.375 -2.5,-3.375 -2.5,-2.975 -1.05,-2.975 ; -1.05,-0.835 -2.5,-0.835 -2.5,-0.435 -1.05,-0.435 ; -1.05,1.705 -2.5,1.705 -2.5,2.105 -1.05,2.105 ; -1.05,4.245 -2.5,4.245 -2.5,4.645 -1.05,4.645 ; -1.05,6.785 -2.5,6.785 -2.5,7.185 -1.05,7.185 ; -1.05,9.325 -2.5,9.325 -2.5,9.725 -1.05,9.725 ; -1.05,11.865 -2.5,11.865 -2.5,12.265 -1.05,12.265 ; -1.05,14.405 -2.5,14.405 -2.5,14.805 -1.05,14.805 ; -1.05,16.945 -2.5,16.945 -2.5,17.345 -1.05,17.345 ; -1.05,19.485 -2.5,19.485 -2.5,19.885 -1.05,19.885 ; 1.05,-19.885 2.5,-19.885 2.5,-19.485 1.05,-19.485 ; 1.05,-17.345 2.5,-17.345 2.5,-16.945 1.05,-16.945 ; 1.05,-14.805 2.5,-14.805 2.5,-14.405 1.05,-14.405 ; 1.05,-12.265 2.5,-12.265 2.5,-11.865 1.05,-11.865 ; 1.05,-9.725 2.5,-9.725 2.5,-9.325 1.05,-9.325 ; 1.05,-7.185 2.5,-7.185 2.5,-6.785 1.05,-6.785 ; 1.05,-4.645 2.5,-4.645 2.5,-4.245 1.05,-4.245 ; 1.05,-2.105 2.5,-2.105 2.5,-1.705 1.05,-1.705 ; 1.05,0.435 2.5,0.435 2.5,0.835 1.05,0.835 ; 1.05,2.975 2.5,2.975 2.5,3.375 1.05,3.375 ; 1.05,5.515 2.5,5.515 2.5,5.915 1.05,5.915 ; 1.05,8.055 2.5,8.055 2.5,8.455 1.05,8.455 ; 1.05,10.595 2.5,10.595 2.5,10.995 1.05,10.995 ; 1.05,13.135 2.5,13.135 2.5,13.535 1.05,13.535 ; 1.05,15.675 2.5,15.675 2.5,16.075 1.05,16.075 ; 1.05,18.215 2.5,18.215 2.5,18.615 1.05,18.615 ; -1.05,19.885 -0.615,20.32 1.05,20.32 1.05,-20.32 -1.05,-20.32 -1.05,19.885
  text "'.Designator'" at 0.84,-4.047 h1

## PinHeader_1x32_P1.27mm_Vertical_SMD_Pin1Right [mm]
pads (32):
  rect 3x0.65 smd: 1(1.5,19.685) 2(-1.5,18.415) 3(1.5,17.145) 4(-1.5,15.875) 5(1.5,14.605) 6(-1.5,13.335) 7(1.5,12.065) 8(-1.5,10.795) 9(1.5,9.525) 10(-1.5,8.255) 11(1.5,6.985) 12(-1.5,5.715) 13(1.5,4.445) 14(-1.5,3.175) 15(1.5,1.905) 16(-1.5,0.635) 17(1.5,-0.635) 18(-1.5,-1.905) 19(1.5,-3.175) 20(-1.5,-4.445) 21(1.5,-5.715) 22(-1.5,-6.985) 23(1.5,-8.255) 24(-1.5,-9.525) 25(1.5,-10.795) 26(-1.5,-12.065) 27(1.5,-13.335) 28(-1.5,-14.605) 29(1.5,-15.875) 30(-1.5,-17.145) 31(1.5,-18.415) 32(-1.5,-19.685)
F.SilkS:
  lines w0.12: -1.11,-20.27 -1.11,-20.38 1.11,-20.38 ; -1.11,-19.1 -1.11,-17.73 ; -1.11,-16.56 -1.11,-15.19 ; -1.11,-14.02 -1.11,-12.65 ; -1.11,-11.48 -1.11,-10.11 ; -1.11,-8.94 -1.11,-7.57 ; -1.11,-6.4 -1.11,-5.03 ; -1.11,-3.86 -1.11,-2.49 ; -1.11,-1.32 -1.11,0.05 ; -1.11,1.22 -1.11,2.59 ; -1.11,3.76 -1.11,5.13 ; -1.11,6.3 -1.11,7.67 ; -1.11,8.84 -1.11,10.21 ; -1.11,11.38 -1.11,12.75 ; -1.11,13.92 -1.11,15.29 ; -1.11,16.46 -1.11,17.83 ; -1.11,19 -1.11,20.37 ; -1.11,20.38 1.11,20.38 1.11,20.27 2.94,20.27 ; 1.11,-20.37 1.11,-19 ; 1.11,-17.83 1.11,-16.46 ; 1.11,-15.29 1.11,-13.92 ; 1.11,-12.75 1.11,-11.38 ; 1.11,-10.21 1.11,-8.84 ; 1.11,-7.67 1.11,-6.3 ; 1.11,-5.13 1.11,-3.76 ; 1.11,-2.59 1.11,-1.22 ; 1.11,-0.05 1.11,1.32 ; 1.11,2.49 1.11,3.86 ; 1.11,5.03 1.11,6.4 ; 1.11,7.57 1.11,8.94 ; 1.11,10.11 1.11,11.48 ; 1.11,12.65 1.11,14.02 ; 1.11,15.19 1.11,16.56 ; 1.11,17.73 1.11,19.1
F.CrtYd:
  lines w0.05: -3.5,-20.85 3.5,-20.85 3.5,20.85 -3.5,20.85 -3.5,-20.85
F.Fab:
  lines w0.1: -1.05,-19.885 -2.5,-19.885 -2.5,-19.485 -1.05,-19.485 ; -1.05,-17.345 -2.5,-17.345 -2.5,-16.945 -1.05,-16.945 ; -1.05,-14.805 -2.5,-14.805 -2.5,-14.405 -1.05,-14.405 ; -1.05,-12.265 -2.5,-12.265 -2.5,-11.865 -1.05,-11.865 ; -1.05,-9.725 -2.5,-9.725 -2.5,-9.325 -1.05,-9.325 ; -1.05,-7.185 -2.5,-7.185 -2.5,-6.785 -1.05,-6.785 ; -1.05,-4.645 -2.5,-4.645 -2.5,-4.245 -1.05,-4.245 ; -1.05,-2.105 -2.5,-2.105 -2.5,-1.705 -1.05,-1.705 ; -1.05,0.435 -2.5,0.435 -2.5,0.835 -1.05,0.835 ; -1.05,2.975 -2.5,2.975 -2.5,3.375 -1.05,3.375 ; -1.05,5.515 -2.5,5.515 -2.5,5.915 -1.05,5.915 ; -1.05,8.055 -2.5,8.055 -2.5,8.455 -1.05,8.455 ; -1.05,10.595 -2.5,10.595 -2.5,10.995 -1.05,10.995 ; -1.05,13.135 -2.5,13.135 -2.5,13.535 -1.05,13.535 ; -1.05,15.675 -2.5,15.675 -2.5,16.075 -1.05,16.075 ; -1.05,18.215 -2.5,18.215 -2.5,18.615 -1.05,18.615 ; 1.05,-18.615 2.5,-18.615 2.5,-18.215 1.05,-18.215 ; 1.05,-16.075 2.5,-16.075 2.5,-15.675 1.05,-15.675 ; 1.05,-13.535 2.5,-13.535 2.5,-13.135 1.05,-13.135 ; 1.05,-10.995 2.5,-10.995 2.5,-10.595 1.05,-10.595 ; 1.05,-8.455 2.5,-8.455 2.5,-8.055 1.05,-8.055 ; 1.05,-5.915 2.5,-5.915 2.5,-5.515 1.05,-5.515 ; 1.05,-3.375 2.5,-3.375 2.5,-2.975 1.05,-2.975 ; 1.05,-0.835 2.5,-0.835 2.5,-0.435 1.05,-0.435 ; 1.05,1.705 2.5,1.705 2.5,2.105 1.05,2.105 ; 1.05,4.245 2.5,4.245 2.5,4.645 1.05,4.645 ; 1.05,6.785 2.5,6.785 2.5,7.185 1.05,7.185 ; 1.05,9.325 2.5,9.325 2.5,9.725 1.05,9.725 ; 1.05,11.865 2.5,11.865 2.5,12.265 1.05,12.265 ; 1.05,14.405 2.5,14.405 2.5,14.805 1.05,14.805 ; 1.05,16.945 2.5,16.945 2.5,17.345 1.05,17.345 ; 1.05,19.485 2.5,19.485 2.5,19.885 1.05,19.885 ; 1.05,19.885 1.05,-20.32 -1.05,-20.32 -1.05,20.32 0.615,20.32 1.05,19.885
  text "'.Designator'" at 0.84,-4.047 h1

## PinHeader_1x33_P1.27mm_Horizontal [mm]
pads (33):
  rect 1x1 hole 0.65: 1(0,0)
  rrect100% 1x1 hole 0.65: 2(0,-1.27) 3(0,-2.54) 4(0,-3.81) 5(0,-5.08) 6(0,-6.35) 7(0,-7.62) 8(0,-8.89) 9(0,-10.16) 10(0,-11.43) 11(0,-12.7) 12(0,-13.97) 13(0,-15.24) 14(0,-16.51) 15(0,-17.78) 16(0,-19.05) 17(0,-20.32) 18(0,-21.59) 19(0,-22.86) 20(0,-24.13) 21(0,-25.4) 22(0,-26.67) 23(0,-27.94) 24(0,-29.21) 25(0,-30.48) 26(0,-31.75) 27(0,-33.02) 28(0,-34.29) 29(0,-35.56) 30(0,-36.83) 31(0,-38.1) 32(0,-39.37) 33(0,-40.64)
F.SilkS:
  drawing of 172 lines, arcs and shapes, not listed
F.CrtYd:
  lines w0.05: -1.15,-41.8 6,-41.8 6,1.15 -1.15,1.15 -1.15,-41.8
F.Fab:
  drawing of 203 lines, arcs and shapes, not listed
  text "'.Designator'" at 1.504,-22.748 h0.6

## PinHeader_1x33_P1.27mm_Vertical [mm]
pads (33):
  rect 1x1 hole 0.65: 1(0,0)
  rrect100% 1x1 hole 0.65: 2(0,-1.27) 3(0,-2.54) 4(0,-3.81) 5(0,-5.08) 6(0,-6.35) 7(0,-7.62) 8(0,-8.89) 9(0,-10.16) 10(0,-11.43) 11(0,-12.7) 12(0,-13.97) 13(0,-15.24) 14(0,-16.51) 15(0,-17.78) 16(0,-19.05) 17(0,-20.32) 18(0,-21.59) 19(0,-22.86) 20(0,-24.13) 21(0,-25.4) 22(0,-26.67) 23(0,-27.94) 24(0,-29.21) 25(0,-30.48) 26(0,-31.75) 27(0,-33.02) 28(0,-34.29) 29(0,-35.56) 30(0,-36.83) 31(0,-38.1) 32(0,-39.37) 33(0,-40.64)
F.SilkS:
  lines w0.12: -1.11,0 -1.11,0.76 0,0.76 ; -0.563,-0.76 -1.11,-0.76 -1.11,-41.335 -0.308,-41.335 ; 0.308,-41.335 1.11,-41.335 1.11,-0.76 0.563,-0.76
F.CrtYd:
  lines w0.05: -1.55,-41.8 -1.55,1.15 1.55,1.15 1.55,-41.8 -1.55,-41.8
F.Fab:
  lines w0.1: -1.05,-41.275 1.05,-41.275 1.05,0.635 -0.525,0.635 -1.05,0.11 -1.05,-41.275
  text "'.Designator'" at 0.84,-24.367 h1